# Altium footprint library Miscellaneous footprints.PcbLib: 84 footprints (part 1 of 6)
Each footprint in its own frame and in the unit in brackets; x right, y up, seen from the top. Pads: shape width x height; smd on the part's side, far side on the other; paste and mask are expansions set on the pad; w line width, h text height; cw(c..) or ccw(c..) is an arc to the next point about the centre after c.
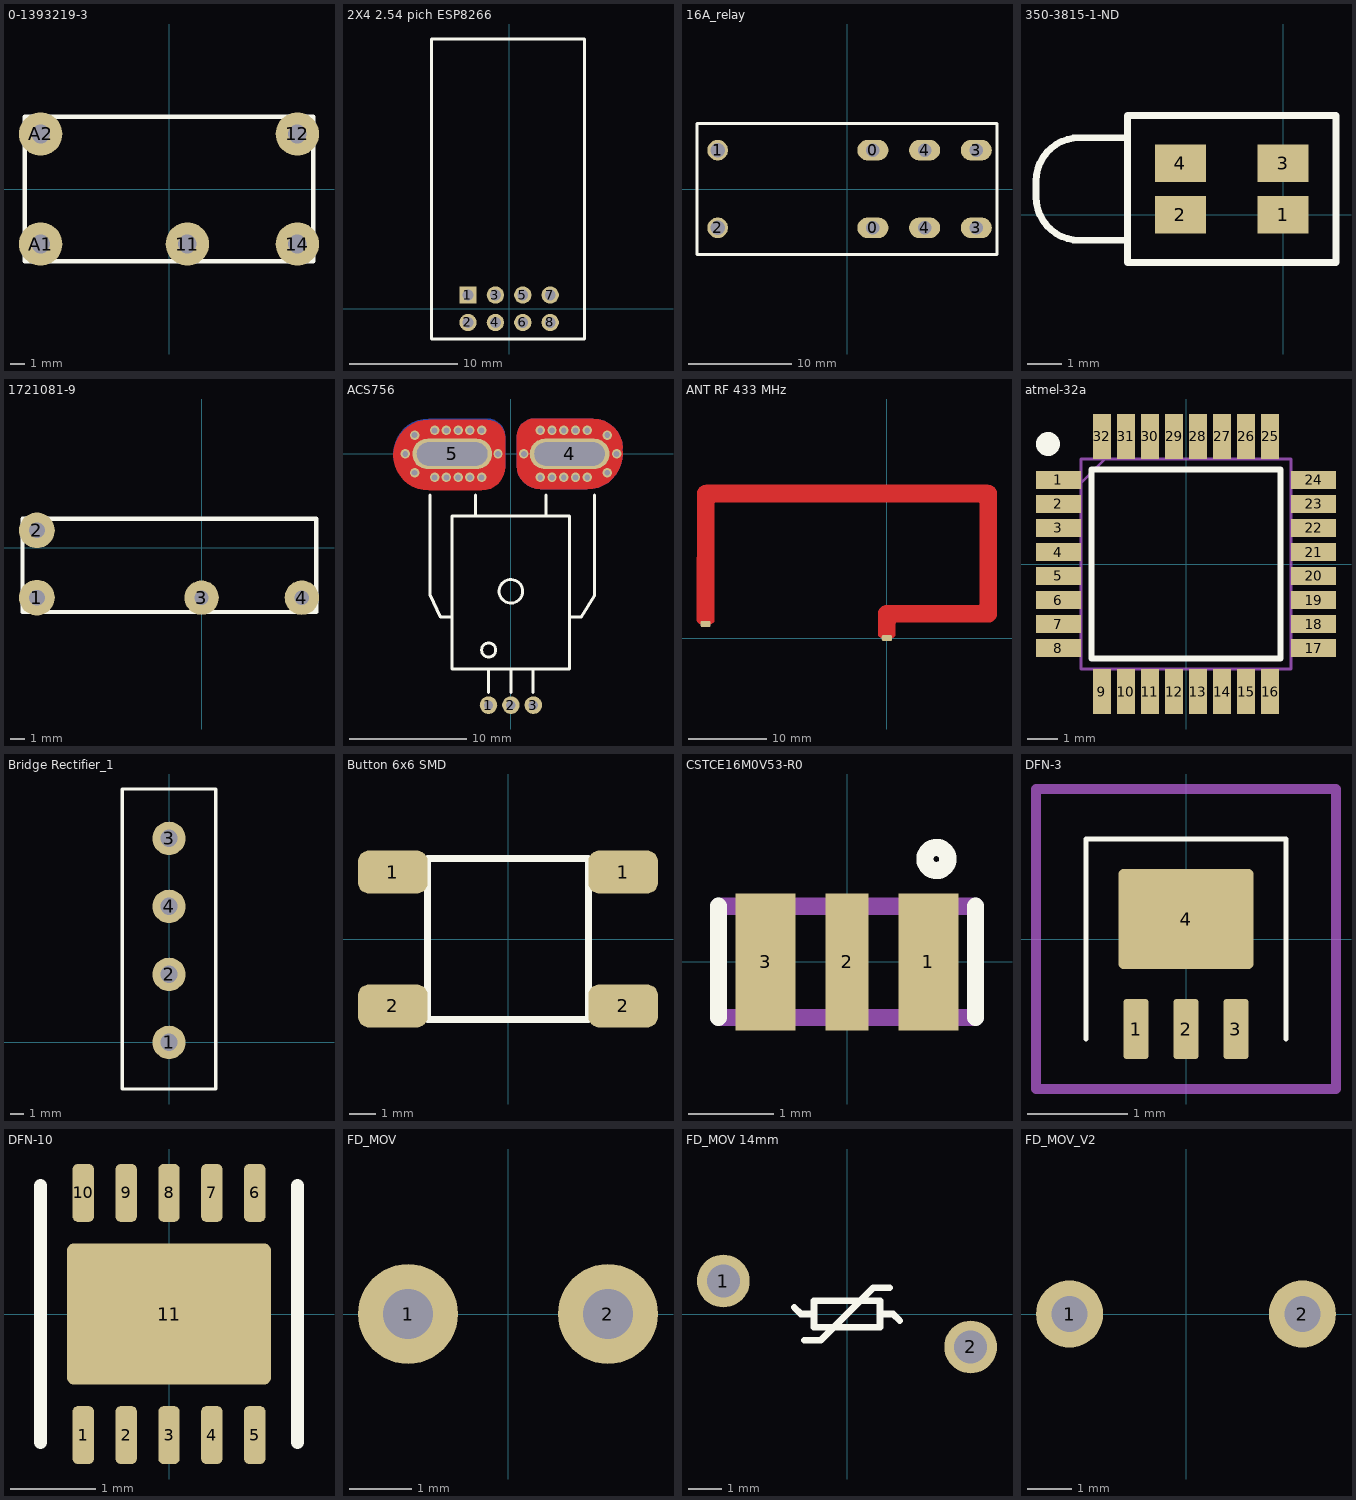
[diagram p0: the footprints below, top view; thin cyan lines are the x and y axes]

## 0-1393219-3 [mm] "0-1393219-3"
pads (5):
  round 3 hole 1.3: 11(1.27,-3.81) 12(8.89,3.81) 14(8.89,-3.81) A1(-8.89,-3.81) A2(-8.89,3.81)
Top Overlay:
  lines w0.3: -10,-5 -10,0 -10,5 0,5 10,5 10,0 10,-5 0,-5 -10,-5
3D body: height 10, standoff -3.8, extent -10,-5 10,5

## 2X4 2.54 pich ESP8266 [mm] "2X4 2.54 pich ESP8266"
height 9.75
pads (8):
  rect 1.6x1.6 hole 1: 1(-3.81,1.27)
  round 1.6 hole 1: 2(-3.81,-1.27) 3(-1.27,1.27) 4(-1.27,-1.27) 5(1.27,1.27) 6(1.27,-1.27) 7(3.81,1.27) 8(3.81,-1.27)
Top Overlay:
  lines w0.254: -7.2,-2.8 0,-2.8 7,-2.8 7,25 -7.2,25 -7.2,-2.8

## 16A_relay [mm]
pads (8):
  oval 3x2 hole 1.3: 0(2.5,-3.75) 0(2.5,3.75) 3(12.5,-3.75) 3(12.5,3.75) 4(7.5,-3.75) 4(7.5,3.75)
  round 2 hole 1.4: 1(-12.5,3.75) 2(-12.5,-3.75)
Top Overlay:
  lines w0.3: -14.5,-6.35 -14.5,6.35 0,6.35 14.5,6.35 14.5,0 14.5,-6.35 0,-6.35 -14.5,-6.35

## 350-3815-1-ND [mm] "350-3815-1-ND"
pads (4):
  rect 1.5x1.1 smd: 1(0,0) 2(-3,0) 3(0,1.5) 4(-3,1.5)
Top Overlay:
  lines w0.2: -4.55,0.75 -4.55,-0.75 -5.955,-0.75 cw(c-5.955,0.52) -7.225,0.52 -7.225,0.75 -7.225,0.98 cw(c-5.955,0.98) -5.955,2.25 -4.55,2.25 -4.55,0.75 ; -4.55,0.75 -4.55,2.9 -1.5,2.9 1.55,2.9 1.55,0.75 1.55,-1.4 -1.5,-1.4 -4.55,-1.4 -4.55,0.75

## 1721081-9 [mm] "relay"
pads (4):
  round 2.5 hole 1.1: 1(-11.5,-3.5) 2(-11.5,1.2)
  round 2.4 hole 1: 3(0,-3.5) 4(7,-3.5)
Top Overlay:
  lines w0.3: -11.5,-4.5 -12.5,-4.5 ; -11.5,1.2 -11.5,2 -12.5,2 ; -12.5,-4.5 8,-4.5 8,2 -12.5,2 ; -12.5,-4.5 -12.5,2
3D body: height 15, standoff 0, extent -12.65,-4.65 8.15,2.15

## ACS756 [mm] "ACS756"
height 7
pads (5):
  round 1.5 hole 0.8: 1(-1.91,-21.4) 2(0,-21.4) 3(1.91,-21.4)
  oval 6.8x2.6 hole 2 slot 6 at 0 deg: 4(5,0) 5(-5,0)
via -8.2,1.6 diameter 0.8 hole 0.5
via -8.2,-1.6 diameter 0.8 hole 0.5
via 8.2,-1.6 diameter 0.8 hole 0.5
via 8.2,1.6 diameter 0.8 hole 0.5
via 1.1,0 diameter 0.8 hole 0.5
via -1.1,0 diameter 0.8 hole 0.5
via -9,0 diameter 0.8 hole 0.5
via 9,0 diameter 0.8 hole 0.5
via -6.5,2 diameter 0.8 hole 0.5
via -5.5,2 diameter 0.8 hole 0.5
via -4.5,2 diameter 0.8 hole 0.5
via -3.5,2 diameter 0.8 hole 0.5
via -2.5,2 diameter 0.8 hole 0.5
via -6.5,-2 diameter 0.8 hole 0.5
via -5.5,-2 diameter 0.8 hole 0.5
via -4.5,-2 diameter 0.8 hole 0.5
via -3.5,-2 diameter 0.8 hole 0.5
via -2.5,-2 diameter 0.8 hole 0.5
via 2.5,2 diameter 0.8 hole 0.5
via 3.5,2 diameter 0.8 hole 0.5
via 4.5,2 diameter 0.8 hole 0.5
via 5.5,2 diameter 0.8 hole 0.5
via 6.5,2 diameter 0.8 hole 0.5
via 2.5,-2 diameter 0.8 hole 0.5
via 3.5,-2 diameter 0.8 hole 0.5
via 4.5,-2 diameter 0.8 hole 0.5
via 5.5,-2 diameter 0.8 hole 0.5
via 6.5,-2 diameter 0.8 hole 0.5
Top Layer:
  region: -0.5,-1.1 -0.493,1.4 -0.522,1.694 -0.607,1.977 -0.747,2.237 -0.934,2.466 -1.163,2.653 -1.423,2.793 -1.706,2.878 -2,2.907 -2,2.9 -7,2.909 -7.471,2.872 -7.93,2.762 -8.366,2.581 -8.769,2.335 -9.128,2.028 -9.435,1.669 -9.681,1.266 -9.862,0.83 -9.972,0.371 -10.009,-0.1 -9.972,-0.571 -9.862,-1.03 -9.681,-1.466 -9.435,-1.869 -9.128,-2.228 -8.769,-2.535 -8.366,-2.781 -7.93,-2.962 -7.471,-3.072 -7,-3.109 -7,-3.1 -2.5,-3.11 -2.108,-3.071 -1.731,-2.957 -1.383,-2.771 -1.079,-2.521 -0.829,-2.217 -0.643,-1.869 -0.529,-1.492 -0.49,-1.1
  region: 0.493,1.5 0.522,1.794 0.607,2.077 0.747,2.337 0.934,2.566 1.163,2.753 1.423,2.893 1.706,2.978 2,3.007 2,3 7,3.012 7.49,2.964 7.961,2.821 8.396,2.589 8.776,2.276 9.089,1.896 9.321,1.461 9.464,0.99 9.512,0.5 9.5,0.5 9.509,0 9.472,-0.471 9.362,-0.93 9.181,-1.366 8.935,-1.769 8.628,-2.128 8.269,-2.435 7.866,-2.681 7.43,-2.862 6.971,-2.972 6.5,-3.009 6.5,-3 2.5,-3.01 2.108,-2.971 1.731,-2.857 1.383,-2.671 1.079,-2.421 0.829,-2.117 0.643,-1.769 0.529,-1.392 0.49,-1 0.5,-1
Bottom Layer:
  region: -0.5,-1 -0.493,1.5 -0.522,1.794 -0.607,2.077 -0.747,2.337 -0.934,2.566 -1.163,2.753 -1.423,2.893 -1.706,2.978 -2,3.007 -2,3 -7,3.009 -7.471,2.972 -7.93,2.862 -8.366,2.681 -8.769,2.435 -9.128,2.128 -9.435,1.769 -9.681,1.366 -9.862,0.93 -9.972,0.471 -10.009,0 -9.972,-0.471 -9.862,-0.93 -9.681,-1.366 -9.435,-1.769 -9.128,-2.128 -8.769,-2.435 -8.366,-2.681 -7.93,-2.862 -7.471,-2.972 -7,-3.009 -7,-3 -2.5,-3.01 -2.108,-2.971 -1.731,-2.857 -1.383,-2.671 -1.079,-2.421 -0.829,-2.117 -0.643,-1.769 -0.529,-1.392 -0.49,-1
  region: 0.493,1.5 0.522,1.794 0.607,2.077 0.747,2.337 0.934,2.566 1.163,2.753 1.423,2.893 1.706,2.978 2,3.007 2,3 7,3.012 7.49,2.964 7.961,2.821 8.396,2.589 8.776,2.276 9.089,1.896 9.321,1.461 9.464,0.99 9.512,0.5 9.5,0.5 9.509,0 9.472,-0.471 9.362,-0.93 9.181,-1.366 8.935,-1.769 8.628,-2.128 8.269,-2.435 7.866,-2.681 7.43,-2.862 6.971,-2.972 6.5,-3.009 6.5,-3 2.5,-3.01 2.108,-2.971 1.731,-2.857 1.383,-2.671 1.079,-2.421 0.829,-2.117 0.643,-1.769 0.529,-1.392 0.49,-1 0.5,-1
Top Overlay:
  circle w0.254: c-1.9,-16.7 r0.6
  circle w0.254: c0,-11.7 r1
  lines w0.254: -6.9,-3.5 -6.9,-12 -6,-13.9 -5,-13.9 ; -3,-5.3 -3,-3.5 ; -1.9,-20.3 -1.9,-18.3 ; 0,-20.3 0,-18.3 ; 1.9,-20.3 1.9,-18.3 ; 3,-5.3 3,-3.5 ; 5,-13.9 6,-13.9 7.1,-12.1 7.1,-3.5 ; -5,-18.3 -5,-5.3 5,-5.3 5,-18.3 -5,-18.3
3D body: height 7, standoff -1.3, extent -6.9,-21.669 7.1,0.873

## ANT RF 433 MHz [mm] "ANT RF 433 MHz"
pads (2):
  rrect50% 1.3x0.8 smd mask+0.102: 1(0,0) 2(-23.2,1.8)
Top Layer:
  region: 0.6,-0.01 0.795,0.029 0.96,0.14 1.071,0.305 1.11,0.5 1.1,0.5 1.096,1.8 1.112,1.878 1.156,1.944 1.222,1.988 1.3,2.004 1.3,2 13,1.991 13.287,2.028 13.555,2.139 13.785,2.315 13.961,2.545 14.072,2.813 14.109,3.1 14.1,3.1 14.109,18.5 14.072,18.787 13.961,19.055 13.785,19.285 13.555,19.461 13.287,19.572 13,19.609 13,19.6 -23.2,19.609 -23.487,19.572 -23.755,19.461 -23.985,19.285 -24.161,19.055 -24.272,18.787 -24.309,18.5 -24.3,18.5 -24.31,2.3 -24.271,2.105 -24.16,1.94 -23.995,1.829 -23.8,1.79 -23.8,1.8 -22.6,1.79 -22.405,1.829 -22.24,1.94 -22.129,2.105 -22.09,2.3 -22.1,2.3 -22.104,17.2 -22.088,17.278 -22.044,17.344 -21.978,17.388 -21.9,17.404 -21.9,17.4 11.7,17.404 11.778,17.388 11.844,17.344 11.888,17.278 11.904,17.2 11.9,17.2 11.904,4.4 11.888,4.322 11.844,4.256 11.778,4.212 11.7,4.196 11.7,4.2 0,4.209 -0.287,4.172 -0.555,4.061 -0.785,3.885 -0.961,3.655 -1.072,3.387 -1.109,3.1 -1.1,3.1 -1.11,0.5 -1.071,0.305 -0.96,0.14 -0.795,0.029 -0.6,-0.01 -0.6,0

## atmel-32a [mm]
pads (32):
  rect 1.5x0.6 smd: 1(-4.25,2.8) 2(-4.25,2) 3(-4.25,1.2) 4(-4.25,0.4) 5(-4.25,-0.4) 6(-4.25,-1.2) 7(-4.25,-2) 8(-4.25,-2.8) 17(4.25,-2.8) 18(4.25,-2) 19(4.25,-1.2) 20(4.25,-0.4) 21(4.25,0.4) 22(4.25,1.2) 23(4.25,2) 24(4.25,2.8)
  rect 0.6x1.5 smd: 9(-2.8,-4.25) 10(-2,-4.25) 11(-1.2,-4.25) 12(-0.4,-4.25) 13(0.4,-4.25) 14(1.2,-4.25) 15(2,-4.25) 16(2.8,-4.25) 25(2.8,4.25) 26(2,4.25) 27(1.2,4.25) 28(0.4,4.25) 29(-0.4,4.25) 30(-1.2,4.25) 31(-2,4.25) 32(-2.8,4.25)
Top Overlay:
  circle w0.4: c-4.6,4 r0.2
  lines w0.2: -3.15,-3.15 -3.15,3.15 3.15,3.15 3.15,-3.15 -3.15,-3.15
Mechanical 15:
  lines w0.1: -3.5,2.7 -2.7,3.5 ; -3.5,-3.5 -3.5,3.5 3.5,3.5 3.5,-3.5 -3.5,-3.5

## Bridge Rectifier_1 [mm] "Bridge Rectifier"
height 19.3
pads (4):
  round 2.5 hole 1.3: 1(0,0) 2(0,5.1) 3(0,15.3) 4(0,10.2)
Top Overlay:
  lines w0.254: -3.5,-3.5 -3.5,19 -1.75,19 0.75,19 3.5,19 3.5,-3.5 -3.5,-3.5

## Button 6x6 SMD [mm] "Button 6x6 SMD"
height 5
pads (4):
  rrect50% 2.6x1.6 smd: 1(-4.3,2.5) 1(4.3,2.5) 2(-4.3,-2.5) 2(4.3,-2.5)
Top Overlay:
  lines w0.254: -3,-3 3,-3 3,3 -3,3 -3,-3
3D body: height 5.51, standoff -0.02, extent -5.017,-3.172 5.017,3.172

## CSTCE16M0V53-R0 [mm]
pads (3):
  rect 0.7x1.6 smd: 1(0.95,0) 3(-0.95,0)
  rect 0.5x1.6 smd: 2(0,0)
Top Overlay:
  circle w0.2: c1.043,1.201 r0.135
  lines w0.2: -1.5,-0.65 -1.5,0.65 ; 1.5,-0.65 1.5,0.65
Mechanical 15:
  lines w0.2: -1.5,-0.65 -1.5,0.65 1.5,0.65 1.5,-0.65 -1.5,-0.65

## DFN-3 [mm] "DFN-3"
height 0.8
pads (4):
  rrect25% 0.25x0.6 smd: 1(-0.5,-0.9) 2(0,-0.9) 3(0.5,-0.9)
  rrect10% 1.35x1 smd: 4(0,0.2)
Top Overlay:
  lines w0.05: -1,-1 -1,1 1,1 1,-1
Mechanical 15:
  lines w0.1: -1.5,-1.5 -1.5,1.5 1.5,1.5 1.5,-1.5 -1.5,-1.5
3D body: height 0.75, standoff -0.05, extent -1,-1.001 1,1

## DFN-10 [mm] "DFN-10"
height 0.75
pads (11):
  rrect50% 0.25x0.675 smd: 1(-1,-1.412) 2(-0.5,-1.412) 3(0,-1.412) 4(0.5,-1.412) 5(1,-1.412) 6(1,1.412) 7(0.5,1.412) 8(0,1.412) 9(-0.5,1.412) 10(-1,1.412)
  rrect10% 2.38x1.65 smd: 11(0,0)
Top Overlay:
  lines w0.15: -1.5,-1.5 -1.5,1.5 ; 1.5,-1.5 1.5,1.5
3D body: height 1.02, standoff -0.05, extent -1.5,-1.5 1.5,1.5

## FD_MOV [mm] "FD_MOV"
pads (2):
  round 1.6 hole 0.8: 1(-1.6,0) 2(1.6,0)
3D body: height 5.5, standoff -1, extent -6,-0.3 4,20

## FD_MOV 14mm [mm] "Metal Oxide Varistor"
pads (2):
  round 1.6 hole 1: 1(-3.75,1) 2(3.75,-1)
Top Overlay:
  lines w0.2: -1.6,0.2 -1.4,0 -1,0 ; -1.3,-0.8 -0.8,-0.8 0,0 0.8,0.8 1.3,0.8 ; 1,0 1.4,0 1.6,-0.2 ; -1,0 -1,-0.4 1,-0.4 1,0.4 -1,0.4 -1,0
3D body: height 19, standoff 0.25, extent -8,-2.75 8,2.75

## FD_MOV_V2 [mm] "FD_MOV_V2"
pads (2):
  round 1.5 hole 0.8: 1(-2.6,0) 2(2.6,0)
3D body: height 7, standoff -0.5, extent -5,-0.3 5,13.3